# Altium footprint library Binh.PcbLib: 863 footprints (part 21 of 54)
Each footprint in its own frame and in the unit in brackets; x right, y up, seen from the top. Pads: shape width x height; smd on the part's side, far side on the other; paste and mask are expansions set on the pad; w line width, h text height; cw(c..) or ccw(c..) is an arc to the next point about the centre after c.
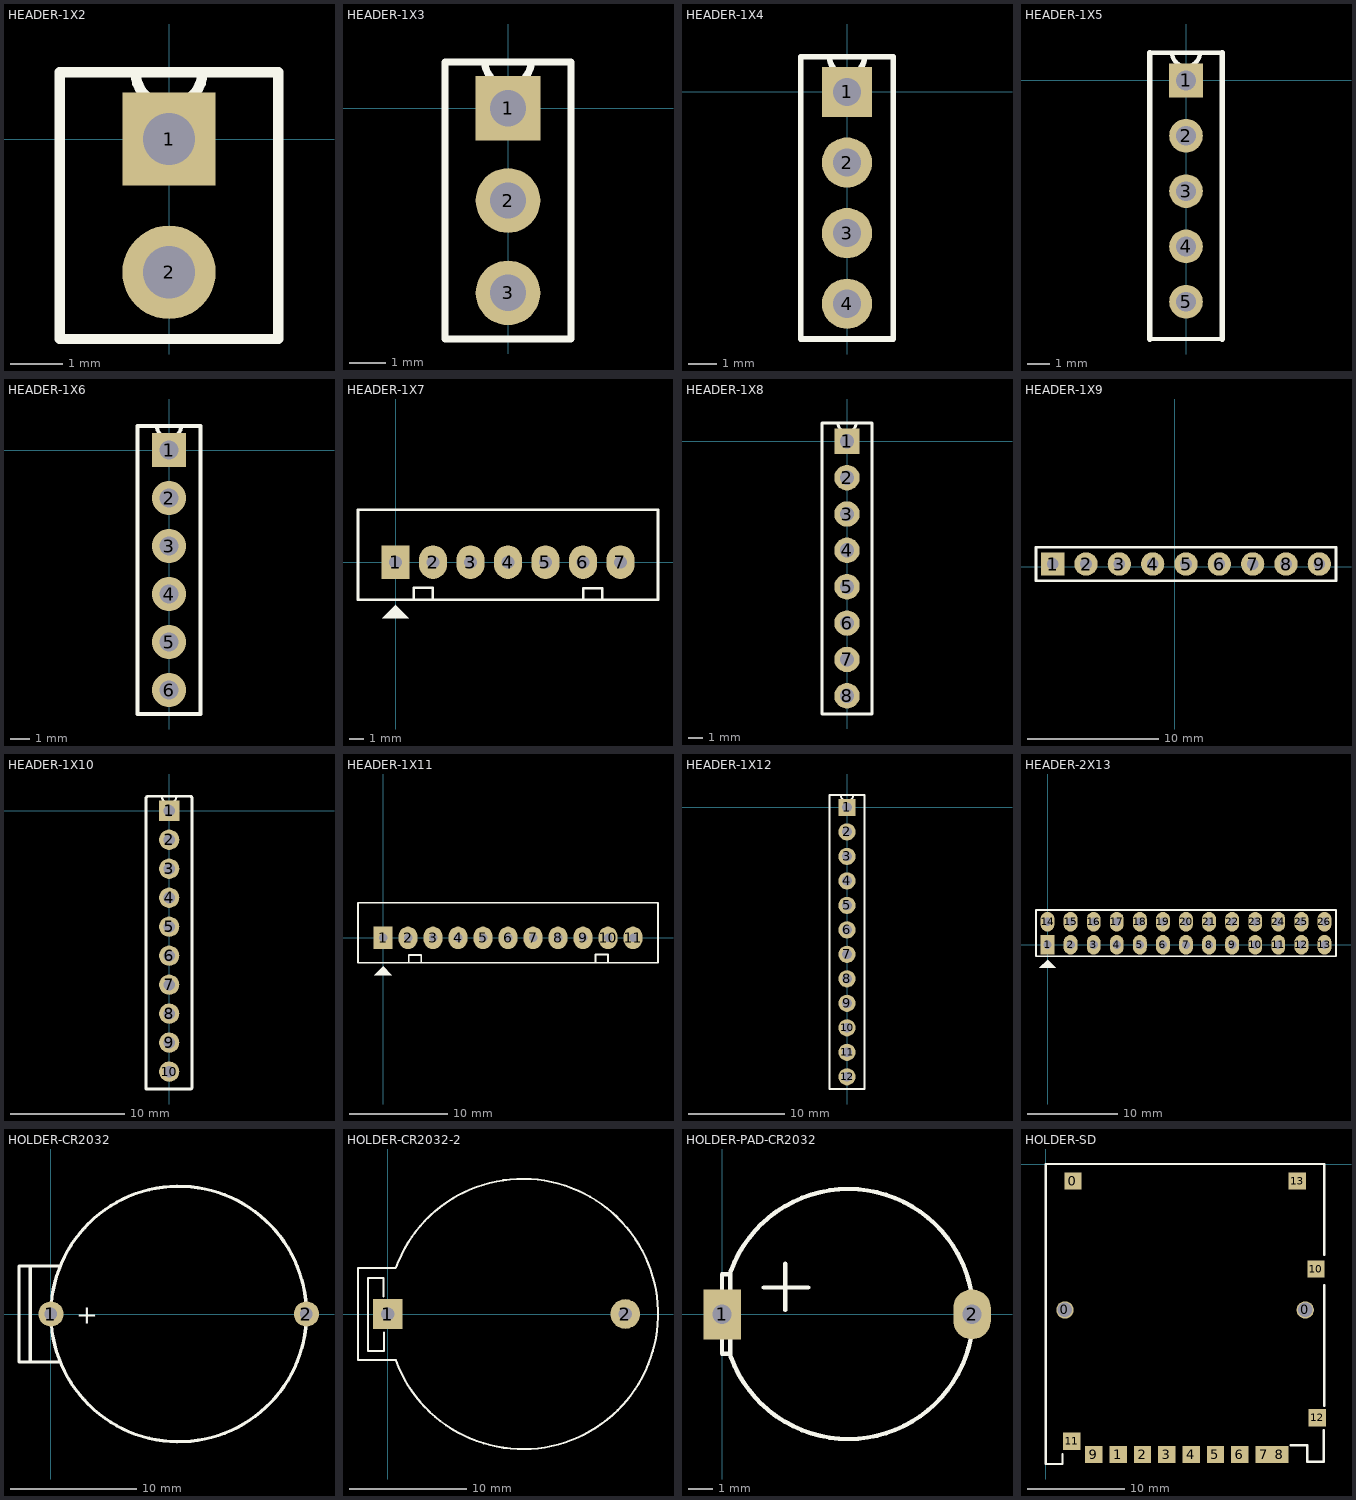
[diagram p20: the footprints below, top view; thin cyan lines are the x and y axes]

## HEADER-1X2 [mil]
pads (2):
  rect 70x70 hole 39.37 unplated: 1(0,0)
  round 70 hole 39.37 unplated: 2(0,-100)
Top Overlay:
  lines w7.87: -82.09,-150 -82.09,50 25,50 cw(c0,50) -25,50 82.09,50 82.09,-150 -82.09,-150
3D body "header-xh2.54-2.STEP": height 275.59, standoff -133.86, extent -133.86,-195.67 92.52,95.67

## HEADER-1X3 [mil]
pads (3):
  rect 70x70 hole 39.37 unplated: 1(0,0)
  round 70 hole 39.37 unplated: 2(0,-100) 3(0,-200)
Top Overlay:
  lines w7.87: -68.31,-250 -68.31,50 25,50 cw(c0,50) -25,50 68.31,50 68.31,-250 -68.31,-250
3D body "HEADER-XH2.54-3.step": height 275.59, standoff -133.86, extent -133.19,-294.88 93.19,94.88

## HEADER-1X4 [mil]
pads (4):
  rect 70x70 hole 39.37 unplated: 1(0,0)
  round 70 hole 39.37 unplated: 2(0,-98.43) 3(0,-196.85) 4(0,-295.28)
Top Overlay:
  lines w7.87: -64.37,-344.49 64.37,-344.49 64.37,49.21 -24.61,49.21 ccw(c0,49.21) 24.61,49.21 -64.37,49.21 -64.37,-344.49
3D body "header-xh2.54-4.STEP": height 275.59, standoff -133.86, extent -133.19,-394.1 93.19,94.1

## HEADER-1X5 [mil]
pads (5):
  rect 60x60 hole 35: 1(0,0)
  round 60 hole 35: 2(0,-98.42) 3(0,-196.85) 4(0,-295.28) 5(0,-393.7)
Top Overlay:
  lines w7.87: -64.37,-460 64.37,-460 ; -64.37,49.21 24.61,49.21 cw(c0,49.21) -24.61,49.21 64.37,49.21
  lines w10: -64.37,-460 -64.37,49.21 ; 64.37,-460 64.37,49.21
3D body "header-xh2.54-5.step": height 275.59, standoff -133.86, extent -133.19,-488.31 93.19,98.31

## HEADER-1X6 [mil]
pads (6):
  rect 70x70 hole 39.37 unplated: 1(0,0)
  round 70 hole 39.37 unplated: 2(0,-98.43) 3(0,-196.85) 4(0,-295.28) 5(0,-393.7) 6(0,-492.13)
Top Overlay:
  lines w7.87: -64.37,-541.34 -64.37,49.21 24.61,49.21 cw(c0,49.21) -24.61,49.21 64.37,49.21 64.37,-541.34 -64.37,-541.34
3D body "header-xh2.54-6.step": height 275.59, standoff -133.86, extent -133.19,-592.52 93.19,92.52

## HEADER-1X7 [mil] "CON7"
height 200
pads (7):
  rect 75x90 hole 34: 1(0,0)
  oval 75x90 hole 34: 2(100,0) 3(200,0) 4(300,0) 5(400,0) 6(500,0) 7(600,0)
Top Overlay:
  region: -35.5,-149.5 35.5,-149.5 0.5,-114.5 0.5,-113.5
  lines w7: 49,-98 49,-68 99,-68 99,-98 ; 501,-99 501,-69 551,-69 551,-99 ; -100,-100 -100,140 700,140 700,0 700,-100 -100,-100
3D body "headder-xh2.54-7.step": height 275.59, standoff -133.86, extent -91.73,-90.04 691.73,136.34

## HEADER-1X8 [mil]
pads (8):
  rect 70x70 hole 39.37 unplated: 1(0,0)
  round 70 hole 39.37 unplated: 2(0,-100) 3(0,-200) 4(0,-300) 5(0,-400) 6(0,-500) 7(0,-600) 8(0,-700)
Top Overlay:
  lines w7.87: -68.31,-750 -68.31,50 25,50 cw(c0,50) -25,50 68.31,50 68.31,-750 -68.31,-750
3D body "header-xh2.54-8.step": height 275.59, standoff -133.86, extent -133.86,-785.94 92.52,95.95

## HEADER-1X9 [mil]
pads (9):
  rect 70x70 hole 35 unplated: 1(-365.83,8.58)
  round 70 hole 35 unplated: 2(-265.83,8.58) 3(-165.83,8.58) 4(-65.83,8.58) 5(34.17,8.58) 6(134.17,8.58) 7(234.17,8.58) 8(334.17,8.58) 9(434.17,8.58)
Top Overlay:
  lines w7.87: -415.83,-41.42 484.17,-41.42 484.17,58.58 -415.83,58.58 -415.83,-41.42

## HEADER-1X10 [mil]
pads (10):
  rect 70x70 hole 39.37 unplated: 1(0,0)
  round 70 hole 39.37 unplated: 2(0,-100) 3(0,-200) 4(0,-300) 5(0,-400) 6(0,-500) 7(0,-600) 8(0,-700) 9(0,-800) 10(0,-900)
Top Overlay:
  lines w7.87: -80,-960 60,-960 ; -72.24,50 25,50 cw(c0,50) -25,50 72.24,50
  lines w10: -72.24,50 ccw(c-72.24,42.24) -80,42.24 -80,-960 73.46,-960 ccw(c73.46,-954.72) 78.74,-954.72 78.74,43.5 ccw(c72.24,43.5) 72.24,50

## HEADER-1X11 [mil] "CON11"
height 200
pads (11):
  rect 75x90 hole 34: 1(0,0)
  oval 75x90 hole 34: 2(100,0) 3(200,0) 4(300,0) 5(400,0) 6(500,0) 7(600,0) 8(700,0) 9(800,0) 10(900,0) 11(1000,0)
Top Overlay:
  region: -35.5,-149.5 35.5,-149.5 0.5,-114.5 0.5,-113.5
  lines w7: 103,-99 103,-69 153,-69 153,-99 ; 850,-97 850,-67 900,-67 900,-97 ; -100,-100 1100,-100 1100,0 1100,140 -100,140 -100,-100

## HEADER-1X12 [mil]
pads (12):
  rect 70x70 hole 39.37 unplated: 1(0,0)
  round 70 hole 39.37 unplated: 2(0,-100) 3(0,-200) 4(0,-300) 5(0,-400) 6(0,-500) 7(0,-600) 8(0,-700) 9(0,-800) 10(0,-900) 11(0,-1000) 12(0,-1100)
Top Overlay:
  lines w7.87: -72.24,-1150 72.24,-1150 72.24,50 -25,50 ccw(c0,50) 25,50 -72.24,50 -72.24,-1150

## HEADER-2X13 [mil] "Header 13x2,26 pin, connecter"
pads (26):
  rect 60x85 hole 36: 1(0,0)
  oval 60x85 hole 36: 2(100,0) 3(200,0) 4(300,0) 5(400,0) 6(500,0) 7(600,0) 8(700,0) 9(800,0) 10(900,0) 11(1000,0) 12(1100,0) 13(1200,0) 14(0,100) 15(100,100) 16(200,100) 17(300,100) 18(400,100) 19(500,100) 20(600,100) 21(700,100) 22(800,100) 23(900,100) 24(1000,100) 25(1100,100) 26(1200,100)
Top Overlay:
  region: 0,-65 -35,-100 35,-100
  lines w8: -50,-50 1250,-50 1250,150 -50,150 -50,-50

## HOLDER-CR2032 [mm]
pads (2):
  round 2 hole 1: 1(0,0) 2(20.32,0)
Top Overlay:
  circle w0.254: c10.16,0 r10.161
  lines w0.254: -1.651,-3.81 -1.651,3.81 ; 0.635,-3.81 -2.54,-3.81 -2.54,3.81 0.635,3.81
  text "+" at 2.032,-0.762 h1.52
3D body "CR2032_HOR_HOLD.STEP": height 8.55, standoff -3.95, extent -0.927,-10.873 23.573,11.127

## HOLDER-CR2032-2 [mil] "Socket PIN 3V"
pads (2):
  rect 100x100 hole 45: 1(0,0)
  round 100 hole 45: 2(800,0)
Top Overlay:
  lines w7: -14,59 -14,121 -66,121 -66,-124 -13,-124 -13,-63 ; 26.33,155 -100,155 -100,-155 27.93,-155 ; 27.6,156.07 cw(c455,0) 27.93,-156.97
3D body "batter2.STEP": height 278.16, standoff -137.2, extent -128.09,-446.83 1001.83,448.83

## HOLDER-PAD-CR2032 [mil] "Socket PIN 3V"
pads (2):
  rect 60x80 hole 31: 1(0,0)
  oval 60x80 hole 31: 2(400,0)
Top Overlay:
  lines w7: 11,64 0,64 0,-63 13,-63 ; 13,-64 13,65 ; 14,-67.81 ccw(c201.94,0.6) 14,69 ; 67,43 138,43 ; 101,7 101,81

## HOLDER-SD [mil]
pads (16):
  round 70 hole 59.05 unplated: 0(76.77,-590.55) 0(1049.21,-590.55)
  rect 70x70 smd: 0(109.25,-68.9) 1(292.32,-1175.55) 2(390.75,-1175.55) 3(489.17,-1175.55) 4(587.6,-1175.55) 5(686.02,-1175.55) 6(784.45,-1175.55) 7(882.87,-1175.55) 8(946.85,-1175.55) 9(193.9,-1175.55) 10(1092.52,-425.2) 11(104.33,-1122.05) 12(1098.43,-1026.38) 13(1016.73,-68.9)
Top Overlay:
  lines w10: 66.93,-1174.07 66.93,-1213.98 0,-1213.98 0,-698.98 0,0 1125.98,0 1125.98,-367.54 ; 990.92,-1138.62 1057.09,-1138.62 1057.09,-1205.55 1124.02,-1205.55 1124.02,-1077.57 ; 1125.98,-978.57 1125.98,-690.55 1125.98,-490.53
3D body "Socket-SD.STEP": height 118.57, standoff -38.91, extent 1.26,-1180.11 1127.24,217.53